# Altium footprint library STguitar.PcbLib: 33 footprints (part 1 of 3)
Each footprint in its own frame and in the unit in brackets; x right, y up, seen from the top. Pads: shape width x height; smd on the part's side, far side on the other; paste and mask are expansions set on the pad; w line width, h text height; cw(c..) or ccw(c..) is an arc to the next point about the centre after c.
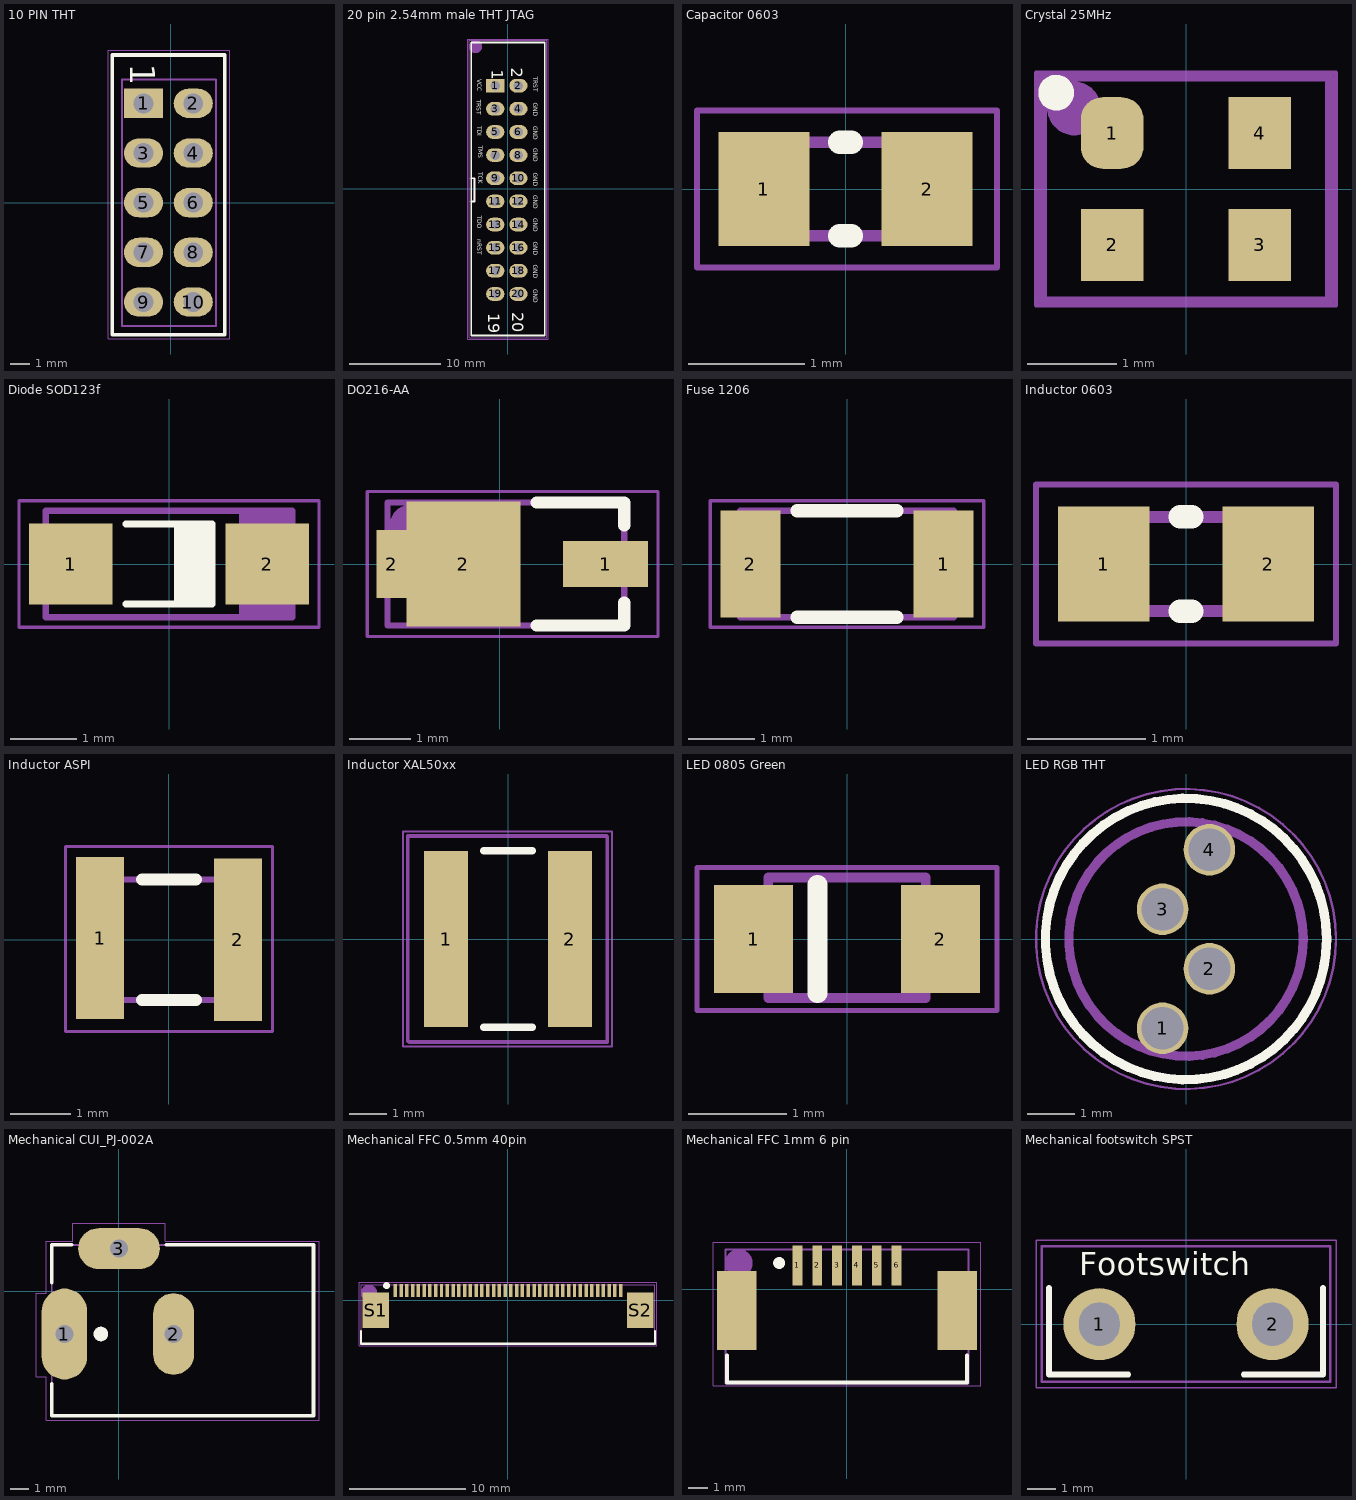
[diagram p0: the footprints below, top view; thin cyan lines are the x and y axes]

## 10 PIN THT [mm]
pads (10):
  rect 2x1.5 hole 1.02: 1(-1.4,5.08)
  oval 2x1.5 hole 1.02: 2(1.14,5.08) 3(-1.4,2.54) 4(1.14,2.54) 5(-1.4,0) 6(1.14,0) 7(-1.4,-2.54) 8(1.14,-2.54) 9(-1.4,-5.08) 10(1.14,-5.08)
Top Overlay:
  lines w0.2: -3,-6.75 -3,7.55 2.75,7.55 2.75,-6.75 -3,-6.75
  text "1" at -2.075,7.1 h1.27
Mechanical 13:
  lines w0.1: -2.5,-6.3 -2.5,6.3 2.3,6.3 2.3,-6.3 -2.5,-6.3
  text ".Designator" at -0.5,5 h1.5
Top Component Outline (Mech15):
  lines w0.05: -3.2,-6.97 -3.2,7.8 3,7.8 3,-6.97 -3.2,-6.97
3D body "s10129381-X10001XLF.stp": height 8.18, standoff -3.25, extent -2.54,-6.35 2.29,6.35

## 20 pin 2.54mm male THT JTAG [mm]
pads (20):
  rect 2x1.5 hole 1.02: 1(-1.4,11.325)
  oval 2x1.5 hole 1.02: 2(1.14,11.325) 3(-1.4,8.785) 4(1.14,8.785) 5(-1.4,6.245) 6(1.14,6.245) 7(-1.4,3.705) 8(1.14,3.705) 9(-1.4,1.165) 10(1.14,1.165) 11(-1.4,-1.375) 12(1.14,-1.375) 13(-1.4,-3.915) 14(1.14,-3.915) 15(-1.4,-6.455) 16(1.14,-6.455) 17(-1.4,-8.995) 18(1.14,-8.995) 19(-1.4,-11.535) 20(1.14,-11.535)
Top Overlay:
  lines w0.2: -3.937,-1.375 -3.662,-1.375 -3.662,1.165 -3.937,1.165 ; -4.025,-16.1 4.025,-16.1 4.025,16.075 -4.025,16.075 -4.025,-16.1
  text "GND" at 2.75,-11.025 h0.5
  text "GND" at 2.75,-8.35 h0.5
  text "GND" at 2.75,-5.775 h0.5
  text "GND" at 2.75,-3.25 h0.5
  text "GND" at 2.75,-0.7 h0.5
  text "GND" at 2.75,1.775 h0.5
  text "GND" at 2.75,4.45 h0.5
  text "GND" at 2.75,6.85 h0.5
  text "GND" at 2.75,9.475 h0.5
  text "TRST" at 2.75,12.325 h0.5
  text "nRST" at -3.35,-5.525 h0.5
  text "TDO" at -3.4,-2.975 h0.5
  text "TCK" at -3.275,1.825 h0.5
  text "TMS" at -3.275,4.725 h0.5
  text "TDI" at -3.35,6.9 h0.5
  text "TRST" at -3.425,9.8 h0.5
  text "VCC" at -3.4,12.025 h0.5
  text "1" at -1.775,13.1 h1.27
  text "2" at 0.362,13.32 h1.27
  text "20" at 0.475,-13.525 h1.27
  text "19" at -2.15,-13.625 h1.27
Mechanical 13:
  lines w0.1: -4.267,-1.372 -3.683,-1.372 -3.683,1.168 -4.267,1.168 ; -4.275,-16.35 4.275,-16.35 4.275,16.325 -4.275,16.325 -4.275,-16.35
  lines w1: -3.356,15.596 cw(c-3.556,15.596) -3.357,15.617
  text ".Designator" at -0.45,8.5 h1.5
Top Component Outline (Mech15):
  lines w0.05: -4.4,-16.475 4.4,-16.475 4.4,16.45 -4.4,16.45 -4.4,-16.475
3D body "idc-20_asm.STEP": height 8.5, standoff -3.7, extent -4.25,-16.375 4.25,16.325

## Capacitor 0603 [mm]
pads (2):
  rect 0.78x0.98 smd: 1(-0.7,0) 2(0.7,0)
Top Overlay:
  lines w0.2: -0.05,-0.4 0.05,-0.4 ; -0.05,0.4 0.05,0.4
Mechanical 13:
  lines w0.1: -0.8,-0.4 -0.8,0.4 0.8,0.4 0.8,-0.4 -0.8,-0.4
  text ".Designator" at -0.635,-0.203 h0.4
Top Component Outline (Mech15):
  lines w0.05: -1.275,-0.675 -1.275,0.675 1.3,0.675 1.3,-0.675 -1.275,-0.675
3D body "User Library-SMD CAPACITOR.step": height 0.8, standoff 0, extent -0.8,-0.4 0.8,0.4

## Crystal 25MHz [mm]
pads (4):
  rrect70% 0.7x0.8 smd: 1(-0.825,0.625)
  rect 0.7x0.8 smd: 2(-0.825,-0.625) 3(0.825,-0.625) 4(0.825,0.625)
Top Overlay:
  circle w0.2: c-1.45,1.075 r0.1
Mechanical 13:
  lines w0.1: -1.6,-1.25 1.6,-1.25 1.6,1.25 -1.6,1.25 -1.6,-1.25
  lines w0.4: -1.25,0.8 cw(c-1.25,0.9) -1.24,0.801
  text ".Designator" at -1.1,-0.125 h0.5
Top Component Outline (Mech15):
  lines w0.05: -1.675,-1.3 -1.675,1.3 1.675,1.3 1.675,-1.3 -1.675,-1.3
3D body "User Library-ECX-32.step": height 0.78, standoff -0.03, extent -1.601,-1.251 1.601,1.251
3D body: height 2.3, standoff -0.4, extent 0,0 0,0

## Diode SOD123f [mm]
pads (2):
  rect 1.25x1.22 smd: 1(-1.475,0) 2(1.475,0)
Top Overlay:
  lines w0.1: -0.65,-0.6 0.275,-0.6 0.275,0.575 ; -0.65,0.6 -0.325,0.6 0.65,0.6 0.65,-0.6 -0.55,-0.6 ; 0.125,-0.6 0.125,0.55 ; 0.175,-0.6 0.175,0.55 ; 0.25,-0.575 0.25,0.55 ; 0.35,0.575 0.35,-0.6 0.575,-0.6 0.575,0.575 ; 0.4,-0.6 0.4,0.575 ; 0.45,-0.6 0.45,0.575 ; 0.525,-0.6 0.525,0.575
Mechanical 13:
  region: 1.05,0.8 1.05,-0.8 1.85,-0.8 1.85,0.8
  lines w0.1: -1.85,-0.8 1.85,-0.8 1.85,0.8 -1.85,0.8 -1.85,-0.8
  text ".Designator" at -1.676,-0.203 h0.5
Top Component Outline (Mech15):
  lines w0.05: -2.25,-0.95 2.25,-0.95 2.25,0.95 -2.25,0.95 -2.25,-0.95
3D body "CircuitWorks-SOD123.step": height 1.32, standoff 0.05, extent -1.85,-0.8 1.85,0.8

## DO216-AA [mm]
pads (3):
  rect 1.38x0.75 smd: 1(1.723,0)
  rect 0.5x1.1 smd: 2(-1.75,0)
  rect 1.85x2.03 smd: 2(-0.587,0)
Top Overlay:
  lines w0.2: 0.6,-1 2.028,-1 2.028,-0.625 ; 0.6,1 2.028,1 2.028,0.625
Mechanical 13:
  lines w0.1: -1.822,-1 2.028,-1 2.028,1 -1.822,1 -1.822,-1
  lines w0.5: -1.436,0.519 cw(c-1.436,0.619) -1.426,0.52
  text ".Designator" at -1.626,-0.457 h0.5
Top Component Outline (Mech15):
  lines w0.05: -2.15,-1.175 -2.15,1.175 2.575,1.175 2.575,-1.175 -2.15,-1.175
3D body "User Library-DO-216AA.STEP": height 1.01, standoff 0, extent -1.822,-1 2.028,1

## Fuse 1206 [mm]
pads (2):
  rect 0.9x1.6 smd: 1(1.45,0) 2(-1.45,0)
Top Overlay:
  lines w0.2: -0.75,-0.8 0.75,-0.8 ; -0.75,0.8 0.75,0.8
Mechanical 13:
  lines w0.1: -1.6,-0.8 1.6,-0.8 1.6,0.8 -1.6,0.8 -1.6,-0.8
  text ".Designator" at -1.6,-0.225 h0.5
Top Component Outline (Mech15):
  lines w0.05: -2.05,-0.95 -2.05,0.95 2.05,0.95 2.05,-0.95 -2.05,-0.95
3D body "sf-1206s-series.stp": height 0.59, standoff -0.02, extent -1.55,-0.775 1.55,0.775

## Inductor 0603 [mm]
pads (2):
  rect 0.78x0.98 smd: 1(-0.7,0) 2(0.7,0)
Top Overlay:
  lines w0.2: -0.05,-0.4 0.05,-0.4 ; -0.05,0.4 0.05,0.4
Mechanical 13:
  lines w0.1: -0.8,-0.4 -0.8,0.4 0.8,0.4 0.8,-0.4 -0.8,-0.4
  text ".Designator" at -0.7,-0.225 h0.5
Top Component Outline (Mech15):
  lines w0.05: -1.275,-0.675 -1.275,0.675 1.275,0.675 1.275,-0.675 -1.275,-0.675
3D body "User Library-FB_1608-1.STEP": height 0.8, standoff 0, extent -0.8,-0.4 0.8,0.4

## Inductor ASPI [mm]
pads (2):
  rect 0.8x2.7 smd: 1(-1.15,0.025) 2(1.15,0)
Top Overlay:
  lines w0.2: -0.45,-1 0.45,-1 ; -0.45,1 0.45,1
Mechanical 13:
  lines w0.1: -1.25,-1 -1.25,1 1.25,1 1.25,-1 -1.25,-1
  text ".Designator" at -0.762,-0.178 h0.5
Top Component Outline (Mech15):
  lines w0.05: -1.725,-1.525 -1.725,1.55 1.725,1.55 1.725,-1.525 -1.725,-1.525
3D body "ASPI-2515.STEP": height 1.5, standoff 0, extent -1.25,-1 1.25,1

## Inductor XAL50xx [mm]
pads (2):
  rect 1.18x4.7 smd: 1(-1.655,0) 2(1.655,0)
Top Overlay:
  lines w0.2: -0.65,-2.35 0.65,-2.35 ; -0.65,2.35 0.65,2.35
Mechanical 13:
  lines w0.1: -2.675,-2.73 -2.675,2.75 2.628,2.75 2.648,2.73 2.648,-2.75 -2.632,-2.75
  text ".Designator" at -2.261,-0.483 h1.5
Top Component Outline (Mech15):
  lines w0.05: -2.8,-2.875 2.775,-2.875 2.775,2.875 -2.8,2.875 -2.8,-2.875
3D body: height 3.1, standoff 0, extent -2.675,-2.73 2.628,2.75

## LED 0805 Green [mm]
pads (2):
  rect 0.8x1.1 smd: 1(-0.95,0) 2(0.95,0)
Top Overlay:
  lines w0.2: -0.3,-0.55 -0.3,0.55
Mechanical 13:
  lines w0.1: -0.8,-0.6 -0.8,0.625 0.8,0.625 0.8,-0.6 -0.8,-0.6
  text ".Designator" at -0.8,-0.225 h0.5
Top Component Outline (Mech15):
  lines w0.05: -1.525,-0.725 -1.525,0.725 1.525,0.725 1.525,-0.725 -1.525,-0.725
3D body "everlight-17-21-0805LED-GREEN.step": height 1.09, standoff -0.02, extent -1,-0.625 1,0.625

## LED RGB THT [mm]
pads (4):
  round 1.1 hole 0.9: 1(-0.5,-1.905) 2(0.5,-0.635) 3(-0.5,0.635) 4(0.5,1.905)
Top Overlay:
  circle w0.2: c0,0 r3
Mechanical 13:
  circle w0.2: c0,0 r2.5
  text ".Designator" at -1.2,-0.45 h1
Top Component Outline (Mech15):
  circle w0.05: c0,0 r3.2
3D body "User Library-5mmBiColorLED.step": height 11.61, standoff -1.83, extent -2.946,-2.946 2.947,2.794

## Mechanical CUI_PJ-002A [mm]
pads (3):
  oval 2.5x5 hole 1 square: 1(-3,-2.35)
  oval 2.25x4.5 hole 1 square: 2(3,-2.35)
  oval 4.5x2.25 hole 1 square: 3(0,2.35)
Top Overlay:
  circle w0.4: c-1,-2.35 r0.2
  lines w0.2: -3.7,-5.1 -3.7,-6.85 10.7,-6.85 10.7,2.55 2.6,2.55 ; -3.7,0.475 -3.7,2.55 -2.6,2.55
Mechanical 13:
  lines w0.1: -3.7,-6.85 10.7,-6.85 10.7,2.55 -3.7,2.55 -3.7,-6.85
  lines w1: -2.619,-2.286 cw(c-2.819,-2.286) -2.62,-2.265
  text ".Designator" at -0.127,-2.87 h2
Top Component Outline (Mech15):
  lines w0.05: -4.55,-4.7 -4.55,-0.1 -4,-0.1 -4,2.75 -2.55,2.75 -2.55,3.75 2.55,3.75 2.55,2.75 11,2.75 11,-7.1 -4,-7.1 -4,-4.7 -4.55,-4.7
3D body "CUI_DEVICES_PJ-002A.step": height 11, standoff -3.5, extent -3.675,-6.85 10.725,2.55

## Mechanical FFC 0.5mm 40pin [mm]
pads (42):
  rect 0.3x1.1 smd: 1(-9.75,0.85) 2(-9.25,0.85) 3(-8.75,0.85) 4(-8.25,0.85) 5(-7.75,0.85) 6(-7.25,0.85) 7(-6.75,0.85) 8(-6.25,0.85) 9(-5.75,0.85) 10(-5.25,0.85) 11(-4.75,0.85) 12(-4.25,0.85) 13(-3.75,0.85) 14(-3.25,0.85) 15(-2.75,0.85) 16(-2.25,0.85) 17(-1.75,0.85) 18(-1.25,0.85) 19(-0.75,0.85) 20(-0.25,0.85) 21(0.25,0.85) 22(0.75,0.85) 23(1.25,0.85) 24(1.75,0.85) 25(2.25,0.85) 26(2.75,0.85) 27(3.25,0.85) 28(3.75,0.85) 29(4.25,0.85) 30(4.75,0.85) 31(5.25,0.85) 32(5.75,0.85) 33(6.25,0.85) 34(6.75,0.85) 35(7.25,0.85) 36(7.75,0.85) 37(8.25,0.85) 38(8.75,0.85) 39(9.25,0.85) 40(9.75,0.85)
  rect 2.3x3.1 smd: S1(-11.42,-0.85) S2(11.42,-0.85)
Top Overlay:
  circle w0.3: c-10.5,1.275 r0.15
  lines w0.2: -12.71,-2.65 -12.71,-3.75 12.71,-3.75 12.71,-2.65
Mechanical 13:
  lines w0.1: -12.71,-3.75 -12.71,-2.15 -12.71,1.36 12.71,1.36 12.71,-2.15 12.71,-3.75 -12.71,-3.75
  lines w1: -11.814,0.66 cw(c-12.014,0.66) -11.815,0.681
  text ".Designator" at -8.525,-1.8 h2
Top Component Outline (Mech15):
  lines w0.05: -12.875,-3.9 -12.875,1.55 12.875,1.55 12.875,-3.9 -12.875,-3.9
3D body "c-4-1734592-0-c-3d.stp": height 2, standoff -0.05, extent -12.71,-3.75 12.72,1.36

## Mechanical FFC 1mm 6 pin [mm]
pads (8):
  rect 0.5x2 smd: 1(-2.5,1.2) 2(-1.5,1.2) 3(-0.5,1.2) 4(0.5,1.2) 5(1.5,1.2) 6(2.5,1.2)
  rect 2x4 smd: ""(-5.575,-1.075) ""(5.575,-1.075)
Top Overlay:
  circle w0.3: c-3.425,1.325 r0.15
  lines w0.2: -6.05,-3.35 -6.05,-4.7 6.05,-4.7 6.05,-3.35
Mechanical 13:
  lines w0.1: -6.125,-4.75 -6.125,2 6.125,2 6.125,-4.75 -6.125,-4.75
  lines w1: -5.261,1.321 cw(c-5.461,1.321) -5.262,1.342
  text ".Designator" at -3.25,-1.775 h0.7
Top Component Outline (Mech15):
  lines w0.05: -6.75,-4.875 -6.75,2.375 6.75,2.375 6.75,-4.875 -6.75,-4.875
3D body "527930670.stp": height 3.1, standoff 0, extent -6.15,-4.8 6.15,2

## Mechanical footswitch SPST [mm]
pads (2):
  round 2.5 hole 1.5 slot 1.4 at 0 deg: 1(-3,0) 2(3,0)
Top Overlay:
  lines w0.2: -4.75,1.25 -4.75,-1.75 -2,-1.75 ; 2,-1.75 4.75,-1.75 4.75,1.25
  text "Footswitch" at -3.7,1.7 h0.8
Mechanical 13:
  lines w0.1: -5,-2 -5,2.7 5,2.7 5,-2 -5,-2
  text ".Designator" at -1.3,-0.2 h0.5
Top Component Outline (Mech15):
  lines w0.05: -5.2,-2.2 -5.2,2.9 5.2,2.9 5.2,-2.2 -5.2,-2.2